# Altium footprint library SCT8-Board.PcbLib: 132 footprints (part 1 of 9)
Each footprint in its own frame and in the unit in brackets; x right, y up, seen from the top. Pads: shape width x height; smd on the part's side, far side on the other; paste and mask are expansions set on the pad; w line width, h text height; cw(c..) or ccw(c..) is an arc to the next point about the centre after c.
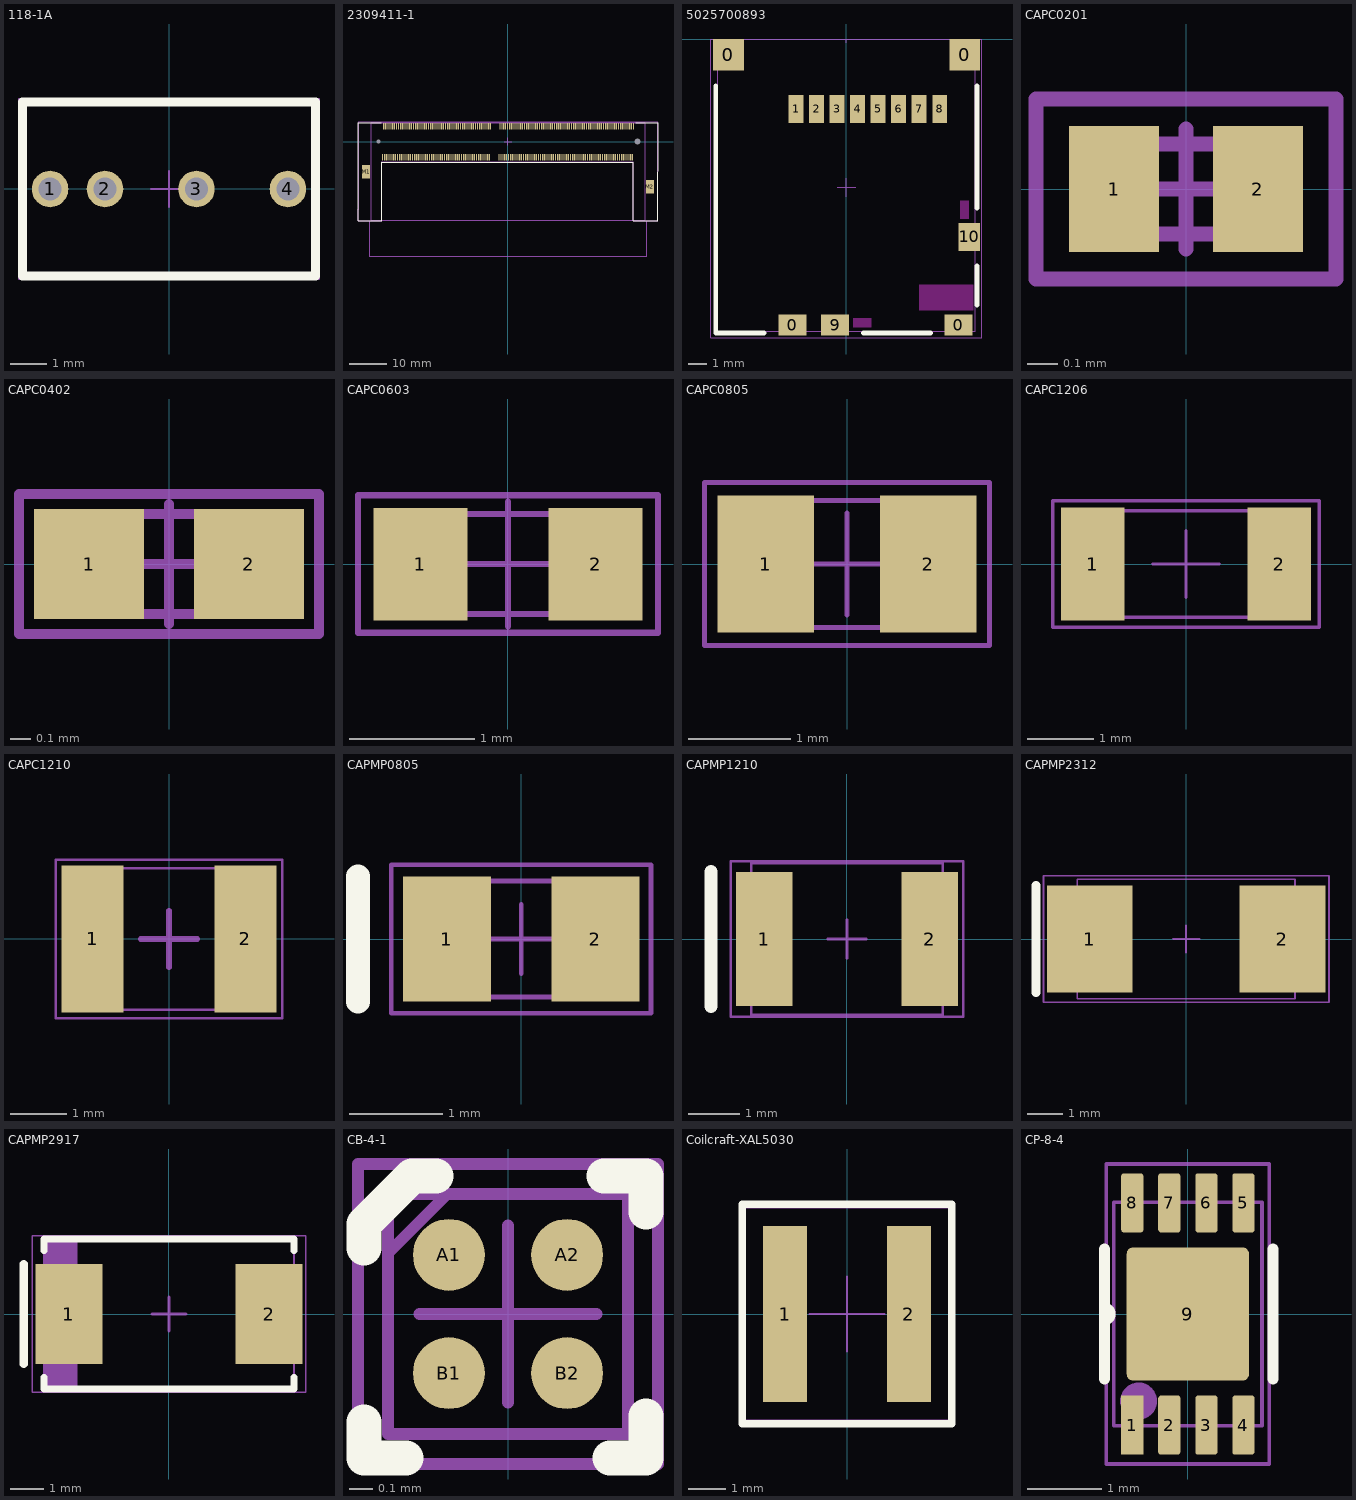
[diagram p0: the footprints below, top view; thin cyan lines are the x and y axes]

## 118-1A [mil] "ATE Relay (NO)"
height 610
pads (4):
  round 40 hole 25: 1(-130,0) 2(-70,0) 3(30,0) 4(130,0)
Top Overlay:
  lines w10: -160,-95 160,-95 160,95 -160,95 -160,-95
Top Courtyard:
  lines w1.97: -163.98,-98.43 -163.98,98.43 163.98,98.43 163.98,-98.43 -163.98,-98.43
Top Designator:
  text ".Designator" at -88.67,-8.9 h39.37
Top Component Center:
  lines w1.97: -19.68,0 19.68,0 ; 0,-19.68 0,19.68
Top Component Outline:
  lines w1.97: -160.04,-94.49 -160.04,94.49 160.04,94.49 160.04,-94.49 -160.04,-94.49
3D body "118-1-A.STEP": height 600, standoff -124.8, extent -160.04,-94.49 160.04,94.49

## 2309411-1 [mm] "DDR4 SODIMM 260P 8.0H STD"
pads (264):
  rect 0.3x1.75 smd: 1(33.375,4.1) 2(33.125,-4.1) 3(32.875,4.1) 4(32.625,-4.1) 5(32.375,4.1) 6(32.125,-4.1) 7(31.875,4.1) 8(31.625,-4.1) 9(31.375,4.1) 10(31.125,-4.1) 11(30.875,4.1) 12(30.625,-4.1) 13(30.375,4.1) 14(30.125,-4.1) 15(29.875,4.1) 16(29.625,-4.1) 17(29.375,4.1) 18(29.125,-4.1) 19(28.875,4.1) 20(28.625,-4.1) 21(28.375,4.1) 22(28.125,-4.1) 23(27.875,4.1) 24(27.625,-4.1) 25(27.375,4.1) 26(27.125,-4.1) 27(26.875,4.1) 28(26.625,-4.1) 29(26.375,4.1) 30(26.125,-4.1) 31(25.875,4.1) 32(25.625,-4.1) 33(25.375,4.1) 34(25.125,-4.1) 35(24.875,4.1) 36(24.625,-4.1) 37(24.375,4.1) 38(24.125,-4.1) 39(23.875,4.1) 40(23.625,-4.1) 41(23.375,4.1) 42(23.125,-4.1) 43(22.875,4.1) 44(22.625,-4.1) 45(22.375,4.1) 46(22.125,-4.1) 47(21.875,4.1) 48(21.625,-4.1) 49(21.375,4.1) 50(21.125,-4.1) 51(20.875,4.1) 52(20.625,-4.1) 53(20.375,4.1) 54(20.125,-4.1) 55(19.875,4.1) 56(19.625,-4.1) 57(19.375,4.1) 58(19.125,-4.1) 59(18.875,4.1) 60(18.625,-4.1) 61(18.375,4.1) 62(18.125,-4.1) 63(17.875,4.1) 64(17.625,-4.1) 65(17.375,4.1) 66(17.125,-4.1) 67(16.875,4.1) 68(16.625,-4.1) 69(16.375,4.1) 70(16.125,-4.1) 71(15.875,4.1) 72(15.625,-4.1) 73(15.375,4.1) 74(15.125,-4.1) 75(14.875,4.1) 76(14.625,-4.1) 77(14.375,4.1) 78(14.125,-4.1) 79(13.875,4.1) 80(13.625,-4.1) 81(13.375,4.1) 82(13.125,-4.1) 83(12.875,4.1) 84(12.625,-4.1) 85(12.375,4.1) 86(12.125,-4.1) 87(11.875,4.1) 88(11.625,-4.1) 89(11.375,4.1) 90(11.125,-4.1) 91(10.875,4.1) 92(10.625,-4.1) 93(10.375,4.1) 94(10.125,-4.1) 95(9.875,4.1) 96(9.625,-4.1) 97(9.375,4.1) 98(9.125,-4.1) 99(8.875,4.1) 100(8.625,-4.1) 101(8.375,4.1) 102(8.125,-4.1) 103(7.875,4.1) 104(7.625,-4.1) 105(7.375,4.1) 106(7.125,-4.1) 107(6.875,4.1) 108(6.625,-4.1) 109(6.375,4.1) 110(6.125,-4.1) 111(5.875,4.1) 112(5.625,-4.1) 113(5.375,4.1) 114(5.125,-4.1) 115(4.875,4.1) 116(4.625,-4.1) 117(4.375,4.1) 118(4.125,-4.1) 119(3.875,4.1) 120(3.625,-4.1) 121(3.375,4.1) 122(3.125,-4.1) 123(2.875,4.1) 124(2.625,-4.1) 125(2.375,4.1) 126(2.125,-4.1) 127(1.875,4.1) 128(1.625,-4.1) 129(1.375,4.1) 130(1.125,-4.1) 131(0.875,4.1) 132(0.625,-4.1) 133(0.375,4.1) 134(0.125,-4.1) 135(-0.125,4.1) 136(-0.375,-4.1) 137(-0.625,4.1) 138(-0.875,-4.1) 139(-1.125,4.1) 140(-1.375,-4.1) 141(-1.625,4.1) 142(-1.875,-4.1) 143(-2.125,4.1) 144(-2.375,-4.1) 145(-4.625,4.1) 146(-4.875,-4.1) 147(-5.125,4.1) 148(-5.375,-4.1) 149(-5.625,4.1) 150(-5.875,-4.1) 151(-6.125,4.1) 152(-6.375,-4.1) 153(-6.625,4.1) 154(-6.875,-4.1) 155(-7.125,4.1) 156(-7.375,-4.1) 157(-7.625,4.1) 158(-7.875,-4.1) 159(-8.125,4.1) 160(-8.375,-4.1) 161(-8.625,4.1) 162(-8.875,-4.1) 163(-9.125,4.1) 164(-9.375,-4.1) 165(-9.625,4.1) 166(-9.875,-4.1) 167(-10.125,4.1) 168(-10.375,-4.1) 169(-10.625,4.1) 170(-10.875,-4.1) 171(-11.125,4.1) 172(-11.375,-4.1) 173(-11.625,4.1) 174(-11.875,-4.1) 175(-12.125,4.1) 176(-12.375,-4.1) 177(-12.625,4.1) 178(-12.875,-4.1) 179(-13.125,4.1) 180(-13.375,-4.1) 181(-13.625,4.1) 182(-13.875,-4.1) 183(-14.125,4.1) 184(-14.375,-4.1) 185(-14.625,4.1) 186(-14.875,-4.1) 187(-15.125,4.1) 188(-15.375,-4.1) 189(-15.625,4.1) 190(-15.875,-4.1) 191(-16.125,4.1) 192(-16.375,-4.1) 193(-16.625,4.1) 194(-16.875,-4.1) 195(-17.125,4.1) 196(-17.375,-4.1) 197(-17.625,4.1) 198(-17.875,-4.1) 199(-18.125,4.1) 200(-18.375,-4.1) 201(-18.625,4.1) 202(-18.875,-4.1) 203(-19.125,4.1) 204(-19.375,-4.1) 205(-19.625,4.1) 206(-19.875,-4.1) 207(-20.125,4.1) 208(-20.375,-4.1) 209(-20.625,4.1) 210(-20.875,-4.1) 211(-21.125,4.1) 212(-21.375,-4.1) 213(-21.625,4.1) 214(-21.875,-4.1) 215(-22.125,4.1) 216(-22.375,-4.1) 217(-22.625,4.1) 218(-22.875,-4.1) 219(-23.125,4.1) 220(-23.375,-4.1) 221(-23.625,4.1) 222(-23.875,-4.1) 223(-24.125,4.1) 224(-24.375,-4.1) 225(-24.625,4.1) 226(-24.875,-4.1) 227(-25.125,4.1) 228(-25.375,-4.1) 229(-25.625,4.1) 230(-25.875,-4.1) 231(-26.125,4.1) 232(-26.375,-4.1) 233(-26.625,4.1) 234(-26.875,-4.1) 235(-27.125,4.1) 236(-27.375,-4.1) 237(-27.625,4.1) 238(-27.875,-4.1) 239(-28.125,4.1) 240(-28.375,-4.1) 241(-28.625,4.1) 242(-28.875,-4.1) 243(-29.125,4.1) 244(-29.375,-4.1) 245(-29.625,4.1) 246(-29.875,-4.1) 247(-30.125,4.1) 248(-30.375,-4.1) 249(-30.625,4.1) 250(-30.875,-4.1) 251(-31.125,4.1) 252(-31.375,-4.1) 253(-31.625,4.1) 254(-31.875,-4.1) 255(-32.125,4.1) 256(-32.375,-4.1) 257(-32.625,4.1) 258(-32.875,-4.1) 259(-33.125,4.1) 260(-33.375,-4.1)
  rect 2x3.5 smd: M1(-37.75,-8) M2(37.75,-12)
  round 0 hole 1.1 unplated: P1(-34.4,0)
  round 0 hole 1.6 unplated: P1(34.4,0)
Top Overlay:
  lines w0.2: -33.75,5 -39.878,5 -39.878,-21 -33.528,-21 -33.528,-5.5 33.274,-5.5 33.274,-21 39.878,-21 39.878,5 34,5
Top Courtyard:
  lines w0.05: -39.878,-21.082 -36.83,-21.082 -33.528,-21.082 -33.528,-5.334 33.274,-5.334 33.274,-21.082 36.83,-21.082 39.878,-21.082 39.878,-18.034 39.878,5.334 -39.878,5.334 -39.878,-18.034 -39.878,-21.082
Top Designator:
  text ".Designator" at -4.511,-0.453 h2
Top Component Center:
  lines w0.1: -1,0 1,0 ; 0,-1 0,1
Top Component Outline:
  lines w0.1: -36.5,-20.85 36.5,-20.85 36.5,5 -36.5,5 -36.5,-20.85
Top Dimensions:
  lines w0.1: -36.83,-21.082 -36.83,-30.5 36.825,-30.5 ; 36.83,-30.5 36.83,-21.082
3D body "2309411-1.STEP": height 8.07, standoff -0.42, extent -38.52,-20.845 38.504,5.005

## 5025700893 [mm] "MicroSD Cage (Molex)"
pads (14):
  rect 1.65x1.7 smd: 0(-6.325,-0.85) 0(6.337,-0.85)
  rect 1.5x1.15 smd: 0(-2.9,-15.325) 0(6,-15.325) 9(-0.6,-15.325)
  rect 0.8x1.5 smd: 1(-2.7,-3.75) 2(-1.6,-3.75) 3(-0.5,-3.75) 4(0.6,-3.75) 5(1.7,-3.75) 6(2.8,-3.75) 7(3.9,-3.75) 8(5,-3.75)
  rect 1.15x1.5 smd: 10(6.575,-10.6)
Top Layer keep-out:
  rectangle: 0.35,-15.45 1.35,-14.95
  rectangle: 3.9,-14.55 6.8,-13.15
  rectangle: 6.075,-9.65 6.575,-8.65
Top Overlay:
  lines w0.254: -7,-2.501 -7,-15.75 -4.4,-15.75 ; 0.9,-15.75 4.5,-15.75 ; 6.999,-2.502 7,-9.05 ; 7,-14.25 7,-12.15
Top Courtyard:
  lines w0.05: -7.263,-16 7.263,-16 7.263,0 0,0 -7.263,0 -7.263,-16
Top Designator:
  text ".Designator" at -4.511,-8.403 h2
Top Component Center:
  lines w0.05: -5.05,0 4.9,0 ; -0.5,-7.95 0.5,-7.95 ; 0,-8.45 0,-7.45 ; 0,-0.204 0,0
Top Component Outline:
  lines w0.05: -6.9,-15.65 6.9,-15.65 6.9,0 0,0 -6.9,0 -6.9,-15.65
3D body "5025700893.step": height 1.8, standoff 0, extent -6.9,-15.65 6.9,1.55

## CAPC0201 [mm] "Chip Capacitor; Body 0.6x0.3mm (LxW typ) [0201], IPC High Density"
height 0.33
pads (2):
  rect 0.3x0.42 smd paste+0 mask+0.05: 1(-0.24,0) 2(0.24,0)
Top Solder:
  rectangle: -0.041,-0.26 0.041,0.26
Top Courtyard:
  lines w0.05: -0.5,-0.3 0.5,-0.3 0.5,0.3 -0.5,0.3 -0.5,-0.3
Top Designator:
  text ".Designator" at -0.451,-0.045 h0.2
Top Component Center:
  lines w0.05: -0.2,0 0.2,0 ; 0,-0.2 0,0.2
Top Component Outline:
  lines w0.05: -0.3,-0.15 0.3,-0.15 0.3,0.15 -0.3,0.15 -0.3,-0.15
3D body "C0201.STEP": height 0.3, standoff 0, extent -0.3,-0.15 0.3,0.15

## CAPC0402 [mm] "Chip Capacitor; Body 1.0x0.5mm (LxW typ) [0402], IPC High Density"
height 0.55
pads (2):
  rect 0.55x0.55 smd paste+0 mask+0.05: 1(-0.4,0) 2(0.4,0)
Top Courtyard:
  lines w0.05: -0.75,-0.35 -0.75,0.35 0.75,0.35 0.75,-0.35 -0.75,-0.35
Top Designator:
  text ".Designator" at -0.564,-0.057 h0.25
Top Component Center:
  lines w0.05: -0.3,0 0.3,0 ; 0,-0.3 0,0.3
Top Component Outline:
  lines w0.05: -0.5,-0.25 0.5,-0.25 0.5,0.25 -0.5,0.25 -0.5,-0.25
3D body "C0402.STEP": height 0.5, standoff 0, extent -0.5,-0.25 0.5,0.25

## CAPC0603 [mm] "Chip Capacitor; Body 1.6x0.8mm (LxW typ) [0603], IPC High Density"
height 0.9
pads (2):
  rect 0.75x0.9 smd: 1(-0.7,0) 2(0.7,0)
Top Courtyard:
  lines w0.05: -1.2,-0.55 1.2,-0.55 1.2,0.55 -1.2,0.55 -1.2,-0.55
Top Designator:
  text ".Designator" at -1.126,-0.113 h0.5
Top Component Center:
  lines w0.05: -0.5,0 0.5,0 ; 0,-0.5 0,0.5
Top Component Outline:
  lines w0.05: -0.8,-0.4 -0.8,0.4 0.8,0.4 0.8,-0.4 -0.8,-0.4
3D body "C0603.STEP": height 0.8, standoff 0, extent -0.8,-0.4 0.8,0.4

## CAPC0805 [mm] "Chip Capacitor; Body 2.0x1.3mm (LxW typ) [0805], IPC High Density"
height 0.95
pads (2):
  rect 0.95x1.35 smd: 1(-0.8,0) 2(0.8,0)
Top Courtyard:
  lines w0.05: -1.4,-0.8 1.4,-0.8 1.4,0.8 -1.4,0.8 -1.4,-0.8
Top Designator:
  text ".Designator" at -1.349,-0.135 h0.6
Top Component Center:
  lines w0.05: -0.5,0 0.5,0 ; 0,-0.5 0,0.5
Top Component Outline:
  lines w0.05: -1,-0.625 1,-0.625 1,0.625 -1,0.625 -1,-0.625
3D body "C0805.STEP": height 0.6, standoff 0, extent -1,-0.625 1,0.625

## CAPC1206 [mm] "Chip Capacitor; Body 3.2x1.6mm (LxW typ) [1206], IPC High Density"
height 1.35
pads (2):
  rect 0.95x1.7 smd: 1(-1.4,0) 2(1.4,0)
Top Courtyard:
  lines w0.05: -2,-0.95 2,-0.95 2,0.95 -2,0.95 -2,-0.95
Top Designator:
  text ".Designator" at -1.912,-0.192 h0.85
Top Component Center:
  lines w0.05: -0.5,0 0.5,0 ; 0,-0.5 0,0.5
Top Component Outline:
  lines w0.05: -1.6,-0.8 1.6,-0.8 1.6,0.8 -1.6,0.8 -1.6,-0.8
3D body "C1206.STEP": height 0.78, standoff 0, extent -1.6,-0.8 1.6,0.8

## CAPC1210 [mm] "Chip Capacitor; Body 3.2x2.5mm (LxW typ) [1210], IPC High Density"
height 1.35
pads (2):
  rect 1.1x2.6 smd: 1(-1.35,0) 2(1.35,0)
Top Courtyard:
  lines w0.05: -2,-1.4 -2,1.4 2,1.4 2,-1.4 -2,-1.4
Top Designator:
  text ".Designator" at -1.912,-0.192 h0.85
Top Component Center:
  lines w0.1: -0.5,0 0.5,0 ; 0,-0.5 0,0.5
Top Component Outline:
  lines w0.05: -1.6,-1.25 1.6,-1.25 1.6,1.25 -1.6,1.25 -1.6,-1.25
3D body "CAP_CL32_SAM.step": height 1, standoff 0, extent -1.6,-1.25 1.6,1.25

## CAPMP0805 [mm] "Molded Capacitor; Tantalum; Body 2.0x1.3mm (LxW typ) [0805], IPC High Density"
height 0.95
pads (2):
  rect 0.95x1.35 smd: 1(-0.8,0) 2(0.8,0)
Top Overlay:
  lines w0.254: -1.758,-0.675 -1.758,0.675
Top Courtyard:
  lines w0.05: -1.4,-0.8 -1.4,0.8 1.4,0.8 1.4,-0.8 -1.4,-0.8
Top Designator:
  text ".Designator" at -1.349,-0.135 h0.6
Top Component Center:
  lines w0.05: -0.375,0 0.375,0 ; 0,-0.375 0,0.375
Top Component Outline:
  lines w0.05: -1,-0.625 1,-0.625 1,0.625 -1,0.625 -1,-0.625
3D body "C0805.STEP": height 0.6, standoff 0, extent -1,-0.625 1,0.625

## CAPMP1210 [mm] "Molded Capacitor; Tantalum; Body 3.2x2.5mm (LxW typ) [1210], IPC High Density"
height 1.35
pads (2):
  rect 1.1x2.6 smd: 1(-1.6,0) 2(1.6,0)
Top Overlay:
  lines w0.254: -2.633,-1.3 -2.633,1.3
Top Courtyard:
  lines w0.05: -2.25,-1.5 -2.25,1.5 2.25,1.5 2.25,-1.5 -2.25,-1.5
Top Designator:
  text ".Designator" at -1.912,-0.192 h0.85
Top Component Center:
  lines w0.05: -0.375,0 0.375,0 ; 0,-0.375 0,0.375
Top Component Outline:
  lines w0.05: -1.85,-1.465 1.85,-1.465 1.85,1.465 -1.85,1.465 -1.85,-1.465
3D body "C1210+.STEP": height 2.03, standoff 0, extent -1.85,-1.465 1.85,1.465

## CAPMP2312 [mm] "Molded Capacitor; Tantalum; Body 6.0x3.2mm (LxW typ) [2312], IPC High Density"
height 2.79
pads (2):
  rect 2.4x3 smd: 1(-2.7,0) 2(2.7,0)
Top Overlay:
  lines w0.254: -4.208,-1.5 -4.208,1.5
Top Courtyard:
  lines w0.05: -4,-1.775 -4,1.775 4,1.775 4,-1.775 -4,-1.775
Top Designator:
  text ".Designator" at -1.912,-0.192 h0.85
Top Component Center:
  lines w0.05: -0.375,0 0.375,0 ; 0,-0.375 0,0.375
Top Component Outline:
  lines w0.05: -3.05,-1.675 3.05,-1.675 3.05,1.675 -3.05,1.675 -3.05,-1.675
3D body "TR3C.STEP": height 2.7, standoff 0, extent -3.05,-1.675 3.05,1.675

## CAPMP2917 [mm] "Molded Capacitor; Tantalum; Body 7.3x4.3mm (LxW typ) [2917]"
height 4.3
pads (2):
  rect 2x3 smd: 1(-3,0) 2(3,0)
Top Overlay:
  lines w0.2: -3.75,-1.9 -3.75,-2.25 3.75,-2.25 3.75,-1.9 ; -3.75,1.9 -3.75,2.25 3.75,2.25 3.75,1.9
  lines w0.254: -4.358,-1.5 -4.358,1.5
Top Courtyard:
  lines w0.05: -4.1,-2.35 4.1,-2.35 4.1,2.35 -4.1,2.35 -4.1,-2.35
Top Designator:
  text ".Designator" at -1.912,-0.192 h0.85
Top Component Center:
  lines w0.1: -0.5,0 0.5,0 ; 0,-0.5 0,0.5
Top Component Outline:
  rectangle: -3.75,-2.25 -2.741,2.25
  lines w0.05: -3.75,-2.25 -3.75,2.25 3.75,2.25 3.75,-2.25 -3.75,-2.25
3D body: height 4.1, standoff 0, extent -3.75,-2.25 3.75,2.25

## CB-4-1 [mm] "4-Ball WLCSP"
pads (4):
  round 0.305 smd paste+0 mask+0.05: A1(-0.25,0.25) A2(0.25,0.25) B1(-0.25,-0.25) B2(0.25,-0.25)
Top Overlay:
  lines w0.15: -0.61,-0.457 -0.61,-0.61 -0.432,-0.61 ; -0.61,0.279 -0.61,0.381 -0.406,0.584 -0.305,0.584 ; 0.406,0.584 0.584,0.584 0.584,0.432 ; 0.432,-0.61 0.584,-0.61 0.584,-0.432
Bottom Overlay:
  text "A" at -0.813,0.127 h0.5
  text "B" at -0.813,-0.508 h0.5
  text "1" at -0.254,0.813 h0.5
  text "2" at 0.432,0.813 h0.5
Top Courtyard:
  lines w0.05: -0.635,-0.635 0.635,-0.635 0.635,0.635 -0.635,0.635 -0.635,-0.635
Top Component Center:
  lines w0.05: -0.375,0 0.375,0 ; 0,-0.375 0,0.375
Top Component Outline:
  lines w0.05: -0.508,0.258 -0.258,0.508 ; -0.508,-0.508 -0.508,0.508 0.508,0.508 0.508,-0.508 -0.508,-0.508
3D body "CB_4_1_ADI.step": height 0.69, standoff 0, extent -0.508,-0.508 0.508,0.508

## Coilcraft-XAL5030 [mil]
pads (2):
  rect 46x185 smd: 1(-65,0) 2(65,0)
Top Overlay:
  lines w7.87: -110,-115 110,-115 110,115 -110,115 -110,-115
Top Courtyard:
  lines w1.97: -111.81,-115.74 111.82,-115.74 111.82,115.75 -111.81,115.75 -111.81,-115.74
Top Component Center:
  lines w1.97: -39.37,0 39.37,0 ; 0,-39.37 0,39.37
Top Component Outline:
  lines w1.97: -107.87,-111.81 -107.87,111.81 107.88,111.81 107.88,-111.81 -107.87,-111.81
3D body "Coilcraft-XAL5030.step": height 122.05, standoff 0, extent -107.87,-111.81 107.88,111.81

## CP-8-4 [mm] "Lead Frame Chip Scale Package, 8-Lead, 2x3mm,"
height 0.75
pads (9):
  rect 0.3x0.8 smd paste+0 mask+0.05: 1(-0.75,-1.5)
  rrect25% 0.3x0.8 smd paste+0 mask+0.05: 2(-0.25,-1.5) 3(0.25,-1.5) 4(0.75,-1.5) 5(0.75,1.5) 6(0.25,1.5) 7(-0.25,1.5) 8(-0.75,1.5)
  rrect10% 1.65x1.8 smd paste+0 mask+0.05: 9(0,0)
Top Overlay:
  lines w0.152: -1.125,-0.875 -1.125,0.875 ; -1.125,-0.075 ccw(c-1.125,0) -1.125,0.075 ; 1.15,-0.875 1.15,0.875
Top Courtyard:
  lines w0.05: -1.1,-2.025 1.1,-2.025 1.1,2.025 -1.1,2.025 -1.1,-2.025
Top Designator:
  text ".Designator" at 0.192,-1.912 h0.85
Top Component Center:
  lines w0.05: -0.375,0 0.375,0 ; 0,-0.375 0,0.375
Top Component Outline:
  circle w0.3: c-0.665,-1.175 r0.1
  lines w0.05: -1,-1.51 1,-1.51 1,1.51 -1,1.51 -1,-1.51
3D body "CP-8-4.STEP": height 0.75, standoff 0, extent -1,-1.51 1,1.51